# Altium footprint library THU VIEN V1.PcbLib: 400 footprints (part 10 of 25)
Each footprint in its own frame and in the unit in brackets; x right, y up, seen from the top. Pads: shape width x height; smd on the part's side, far side on the other; paste and mask are expansions set on the pad; w line width, h text height; cw(c..) or ccw(c..) is an arc to the next point about the centre after c.
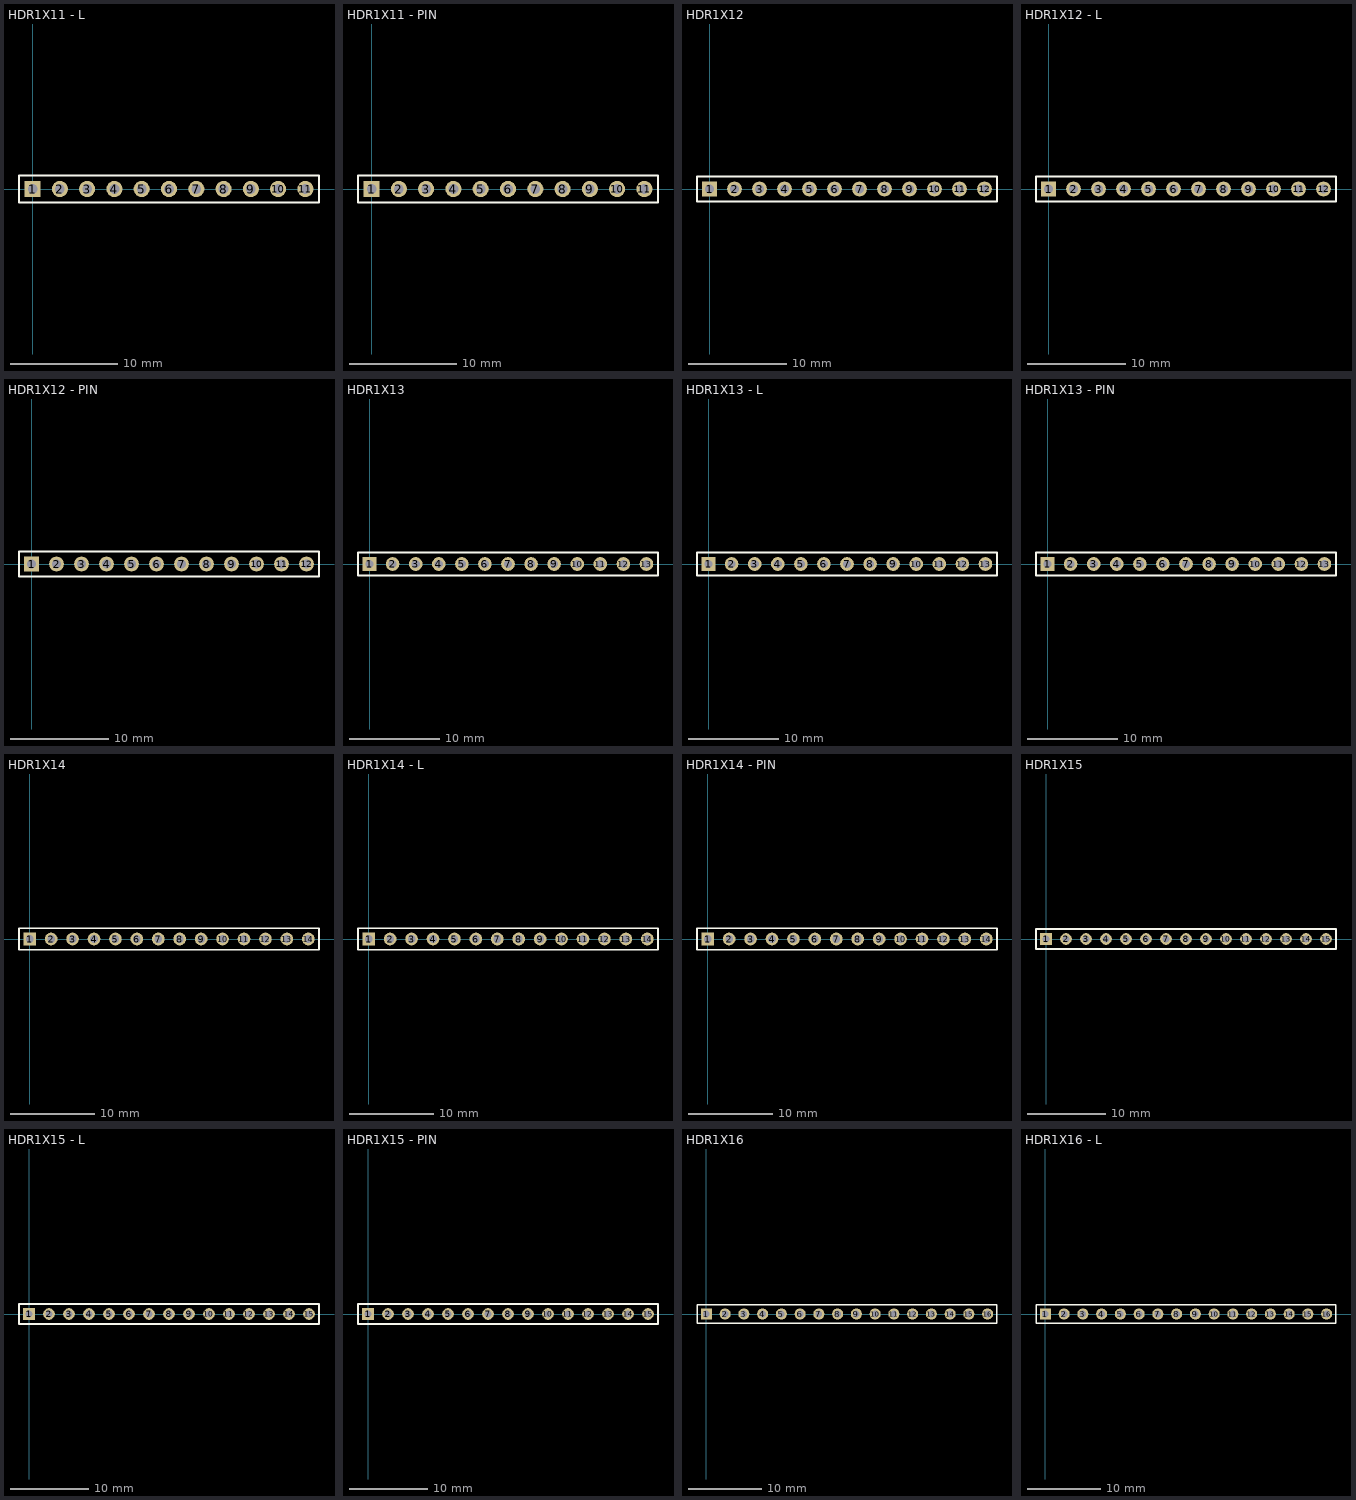
[diagram p9: the footprints below, top view; thin cyan lines are the x and y axes]

## HDR1X11 - L [mm] "Connector; Header; 11 Position"
pads (11):
  rect 1.5x1.5 hole 0.9: 1(0,0)
  round 1.5 hole 0.9: 2(2.54,0) 3(5.08,0) 4(7.62,0) 5(10.16,0) 6(12.7,0) 7(15.24,0) 8(17.78,0) 9(20.32,0) 10(22.86,0) 11(25.4,0)
Top Overlay:
  lines w0.2: -1.27,-1.27 -1.27,1.27 0.635,1.27 26.67,1.27 26.67,-1.27 -1.27,-1.27
3D body: height 4.33, standoff -3, extent -1.27,-1.27 11.43,7
3D body: height 4.33, standoff -3, extent 11.456,-1.27 26.696,7

## HDR1X11 - PIN [mm] "Connector; Header; 11 Position"
pads (11):
  rect 1.5x1.5 hole 0.9: 1(0,0)
  round 1.5 hole 0.9: 2(2.54,0) 3(5.08,0) 4(7.62,0) 5(10.16,0) 6(12.7,0) 7(15.24,0) 8(17.78,0) 9(20.32,0) 10(22.86,0) 11(25.4,0)
Top Overlay:
  lines w0.2: -1.27,-1.27 26.67,-1.27 26.67,1.27 0.635,1.27 -1.27,1.27 -1.27,-1.27
3D body: height 6.02, standoff -3.1, extent 16.485,-1.27 26.645,1.27
3D body: height 6.02, standoff -3.1, extent 6.325,-1.27 16.485,1.27
3D body: height 6.02, standoff -3.1, extent -1.295,-1.27 6.325,1.27

## HDR1X12 [mm] "Connector; Header; 12 Position"
pads (12):
  rect 1.5x1.5 hole 0.9: 1(0,0)
  round 1.5 hole 0.9: 2(2.54,0) 3(5.08,0) 4(7.62,0) 5(10.16,0) 6(12.7,0) 7(15.24,0) 8(17.78,0) 9(20.32,0) 10(22.86,0) 11(25.4,0) 12(27.94,0)
Top Overlay:
  lines w0.2: -1.27,-1.27 -1.27,1.27 0.635,1.27 29.21,1.27 29.21,-1.27 -1.27,-1.27
3D body: height 8.55, standoff -2.43, extent 24.105,-1.27 29.185,1.27
3D body: height 8.55, standoff -2.43, extent 19.112,-1.289 24.192,1.251
3D body: height 8.55, standoff -2.43, extent 14.032,-1.263 19.112,1.277
3D body: height 8.55, standoff -2.43, extent 9.079,-1.289 14.159,1.251
3D body: height 8.55, standoff -2.43, extent 3.962,-1.295 9.042,1.245
3D body: height 8.55, standoff -2.43, extent -1.041,-1.27 4.039,1.27

## HDR1X12 - L [mm] "Connector; Header; 12 Position"
pads (12):
  rect 1.5x1.5 hole 0.9: 1(0,0)
  round 1.5 hole 0.9: 2(2.54,0) 3(5.08,0) 4(7.62,0) 5(10.16,0) 6(12.7,0) 7(15.24,0) 8(17.78,0) 9(20.32,0) 10(22.86,0) 11(25.4,0) 12(27.94,0)
Top Overlay:
  lines w0.2: -1.27,-1.27 29.21,-1.27 29.21,1.27 0.635,1.27 -1.27,1.27 -1.27,-1.27
3D body: height 4.33, standoff -3, extent 13.97,-1.244 29.21,7.026
3D body: height 4.33, standoff -3, extent -1.27,-1.244 13.97,7.026

## HDR1X12 - PIN [mm] "Connector; Header; 12 Position"
pads (12):
  rect 1.5x1.5 hole 0.9: 1(0,0)
  round 1.5 hole 0.9: 2(2.54,0) 3(5.08,0) 4(7.62,0) 5(10.16,0) 6(12.7,0) 7(15.24,0) 8(17.78,0) 9(20.32,0) 10(22.86,0) 11(25.4,0) 12(27.94,0)
Top Overlay:
  lines w0.2: -1.27,-1.27 -1.27,1.27 0.635,1.27 29.21,1.27 29.21,-1.27 -1.27,-1.27
3D body: height 6.02, standoff -3.1, extent 18.999,-1.27 29.159,1.27
3D body: height 6.02, standoff -3.1, extent 8.89,-1.27 19.05,1.27
3D body: height 6.02, standoff -3.1, extent -1.245,-1.27 8.915,1.27

## HDR1X13 [mm] "Connector; Header; 13 Position"
pads (13):
  rect 1.5x1.5 hole 0.9: 1(0,0)
  round 1.5 hole 0.9: 2(2.54,0) 3(5.08,0) 4(7.62,0) 5(10.16,0) 6(12.7,0) 7(15.24,0) 8(17.78,0) 9(20.32,0) 10(22.86,0) 11(25.4,0) 12(27.94,0) 13(30.48,0)
Top Overlay:
  lines w0.2: -1.27,-1.27 -1.27,1.27 0.635,1.27 31.75,1.27 31.75,-1.27 -1.27,-1.27
3D body: height 8.55, standoff -2.43, extent -1.143,-1.346 3.937,1.194
3D body: height 8.55, standoff -2.43, extent 3.937,-1.27 9.017,1.27
3D body: height 8.55, standoff -2.43, extent 8.966,-1.27 14.046,1.27
3D body: height 8.55, standoff -2.43, extent 14.072,-1.27 19.152,1.27
3D body: height 8.52, standoff -2.48, extent 19.05,-1.25 31.75,1.25

## HDR1X13 - L [mm] "Connector; Header; 13 Position"
pads (13):
  rect 1.5x1.5 hole 0.9: 1(0,0)
  round 1.5 hole 0.9: 2(2.54,0) 3(5.08,0) 4(7.62,0) 5(10.16,0) 6(12.7,0) 7(15.24,0) 8(17.78,0) 9(20.32,0) 10(22.86,0) 11(25.4,0) 12(27.94,0) 13(30.48,0)
Top Overlay:
  lines w0.2: -1.27,-1.27 -1.27,1.27 0.635,1.27 31.75,1.27 31.75,-1.27 -1.27,-1.27
3D body: height 4.33, standoff -3, extent -1.245,-1.27 13.995,7
3D body: height 4.33, standoff -3, extent 13.97,-1.27 31.75,7

## HDR1X13 - PIN [mm] "Connector; Header; 13 Position"
pads (13):
  rect 1.5x1.5 hole 0.9: 1(0,0)
  round 1.5 hole 0.9: 2(2.54,0) 3(5.08,0) 4(7.62,0) 5(10.16,0) 6(12.7,0) 7(15.24,0) 8(17.78,0) 9(20.32,0) 10(22.86,0) 11(25.4,0) 12(27.94,0) 13(30.48,0)
Top Overlay:
  lines w0.2: -1.27,-1.27 -1.27,1.27 0.635,1.27 31.75,1.27 31.75,-1.27 -1.27,-1.27
3D body: height 6.02, standoff -3.1, extent -1.245,-1.245 8.915,1.295
3D body: height 6.02, standoff -3.1, extent 8.915,-1.245 16.535,1.295
3D body: height 6.02, standoff -3.1, extent 16.535,-1.245 24.155,1.295
3D body: height 6.02, standoff -3.1, extent 24.155,-1.245 31.775,1.295

## HDR1X14 [mm] "Connector; Header; 14 Position"
pads (14):
  rect 1.5x1.5 hole 0.9: 1(0,0)
  round 1.5 hole 0.9: 2(2.54,0) 3(5.08,0) 4(7.62,0) 5(10.16,0) 6(12.7,0) 7(15.24,0) 8(17.78,0) 9(20.32,0) 10(22.86,0) 11(25.4,0) 12(27.94,0) 13(30.48,0) 14(33.02,0)
Top Overlay:
  lines w0.2: -1.27,-1.27 -1.27,1.27 0.635,1.27 34.29,1.27 34.29,-1.27 -1.27,-1.27
3D body: height 8.55, standoff -2.43, extent 29.17,-1.263 34.25,1.277
3D body: height 8.55, standoff -2.43, extent 24.079,-1.27 29.159,1.27
3D body: height 8.55, standoff -2.43, extent 18.999,-1.27 24.079,1.27
3D body: height 8.55, standoff -2.43, extent 13.905,-1.263 18.985,1.277
3D body: height 8.55, standoff -2.43, extent 8.825,-1.263 13.905,1.277
3D body: height 8.55, standoff -2.43, extent 3.847,-1.263 8.927,1.277
3D body: height 8.55, standoff -2.43, extent -1.107,-1.263 3.973,1.277

## HDR1X14 - L [mm] "Connector; Header; 14 Position"
pads (14):
  rect 1.5x1.5 hole 0.9: 1(0,0)
  round 1.5 hole 0.9: 2(2.54,0) 3(5.08,0) 4(7.62,0) 5(10.16,0) 6(12.7,0) 7(15.24,0) 8(17.78,0) 9(20.32,0) 10(22.86,0) 11(25.4,0) 12(27.94,0) 13(30.48,0) 14(33.02,0)
Top Overlay:
  lines w0.2: -1.27,-1.27 34.29,-1.27 34.29,1.27 0.635,1.27 -1.27,1.27 -1.27,-1.27
3D body: height 4.33, standoff -3, extent -1.219,-1.27 16.561,7
3D body: height 4.33, standoff -3, extent 16.586,-1.27 34.366,7

## HDR1X14 - PIN [mm] "Connector; Header; 14 Position"
pads (14):
  rect 1.5x1.5 hole 0.9: 1(0,0)
  round 1.5 hole 0.9: 2(2.54,0) 3(5.08,0) 4(7.62,0) 5(10.16,0) 6(12.7,0) 7(15.24,0) 8(17.78,0) 9(20.32,0) 10(22.86,0) 11(25.4,0) 12(27.94,0) 13(30.48,0) 14(33.02,0)
Top Overlay:
  lines w0.2: -1.27,-1.27 34.29,-1.27 34.29,1.27 0.635,1.27 -1.27,1.27 -1.27,-1.27
3D body: height 6.02, standoff -3.1, extent 24.13,-1.295 34.29,1.245
3D body: height 6.02, standoff -3.1, extent 13.97,-1.295 24.13,1.245
3D body: height 6.02, standoff -3.1, extent 6.35,-1.295 13.97,1.245
3D body: height 6.02, standoff -3.1, extent -1.27,-1.295 6.35,1.245

## HDR1X15 [mm] "Connector; Header; 15 Position"
pads (15):
  rect 1.5x1.5 hole 0.9: 1(0,0)
  round 1.5 hole 0.9: 2(2.54,0) 3(5.08,0) 4(7.62,0) 5(10.16,0) 6(12.7,0) 7(15.24,0) 8(17.78,0) 9(20.32,0) 10(22.86,0) 11(25.4,0) 12(27.94,0) 13(30.48,0) 14(33.02,0) 15(35.56,0)
Top Overlay:
  lines w0.2: -1.27,-1.27 -1.27,1.27 0.635,1.27 36.83,1.27 36.83,-1.27 -1.27,-1.27
3D body: height 8.52, standoff -2.48, extent -1.27,-1.25 11.43,1.25
3D body: height 8.52, standoff -2.48, extent 11.43,-1.25 24.13,1.25
3D body: height 8.52, standoff -2.48, extent 24.13,-1.25 36.83,1.25

## HDR1X15 - L [mm] "Connector; Header; 15 Position"
pads (15):
  rect 1.5x1.5 hole 0.9: 1(0,0)
  round 1.5 hole 0.9: 2(2.54,0) 3(5.08,0) 4(7.62,0) 5(10.16,0) 6(12.7,0) 7(15.24,0) 8(17.78,0) 9(20.32,0) 10(22.86,0) 11(25.4,0) 12(27.94,0) 13(30.48,0) 14(33.02,0) 15(35.56,0)
Top Overlay:
  lines w0.2: -1.27,-1.27 36.83,-1.27 36.83,1.27 0.635,1.27 -1.27,1.27 -1.27,-1.27
3D body: height 4.33, standoff -3, extent -1.295,-1.244 24.105,7.026
3D body: height 4.33, standoff -3, extent 24.13,-1.27 36.83,7

## HDR1X15 - PIN [mm] "Connector; Header; 15 Position"
pads (15):
  rect 1.5x1.5 hole 0.9: 1(0,0)
  round 1.5 hole 0.9: 2(2.54,0) 3(5.08,0) 4(7.62,0) 5(10.16,0) 6(12.7,0) 7(15.24,0) 8(17.78,0) 9(20.32,0) 10(22.86,0) 11(25.4,0) 12(27.94,0) 13(30.48,0) 14(33.02,0) 15(35.56,0)
Top Overlay:
  lines w0.2: -1.27,-1.27 -1.27,1.27 0.635,1.27 36.83,1.27 36.83,-1.27 -1.27,-1.27
3D body: height 6.02, standoff -3.1, extent 29.159,-1.295 36.779,1.245
3D body: height 6.02, standoff -3.1, extent 19.025,-1.295 29.185,1.245
3D body: height 6.02, standoff -3.1, extent 8.89,-1.295 19.05,1.245
3D body: height 6.02, standoff -3.1, extent -1.27,-1.295 8.89,1.245

## HDR1X16 [mm] "Connector; Header; 16 Position"
pads (16):
  rect 1.5x1.5 hole 0.9: 1(0,0)
  round 1.5 hole 0.9: 2(2.54,0) 3(5.08,0) 4(7.62,0) 5(10.16,0) 6(12.7,0) 7(15.24,0) 8(17.78,0) 9(20.32,0) 10(22.86,0) 11(25.4,0) 12(27.94,0) 13(30.48,0) 14(33.02,0) 15(35.56,0) 16(38.1,0)
Top Overlay:
  lines w0.2: -1.27,-1.27 -1.27,1.27 0.635,1.27 39.37,1.27 39.37,-1.27 -1.27,-1.27
3D body: height 8.55, standoff -2.43, extent -1.143,-1.295 3.937,1.245
3D body: height 8.55, standoff -2.43, extent 3.847,-1.289 8.927,1.251
3D body: height 8.55, standoff -2.43, extent 8.876,-1.289 13.956,1.251
3D body: height 8.55, standoff -2.43, extent 13.919,-1.295 18.999,1.245
3D body: height 8.55, standoff -2.43, extent 18.999,-1.295 24.079,1.245
3D body: height 8.55, standoff -2.43, extent 24.13,-1.295 29.21,1.245
3D body: height 8.55, standoff -2.43, extent 29.196,-1.289 34.276,1.251
3D body: height 8.55, standoff -2.43, extent 34.29,-1.27 39.37,1.27

## HDR1X16 - L [mm] "Connector; Header; 16 Position"
pads (16):
  rect 1.5x1.5 hole 0.9: 1(0,0)
  round 1.5 hole 0.9: 2(2.54,0) 3(5.08,0) 4(7.62,0) 5(10.16,0) 6(12.7,0) 7(15.24,0) 8(17.78,0) 9(20.32,0) 10(22.86,0) 11(25.4,0) 12(27.94,0) 13(30.48,0) 14(33.02,0) 15(35.56,0) 16(38.1,0)
Top Overlay:
  lines w0.2: -1.27,-1.27 -1.27,1.27 0.635,1.27 39.37,1.27 39.37,-1.27 -1.27,-1.27
3D body: height 4.33, standoff -3, extent 13.97,-1.245 39.37,7.025
3D body: height 4.33, standoff -3, extent -1.244,-1.244 13.996,7.026